# Altium footprint library bspd parts.PcbLib: 57 footprints (part 2 of 4)
Each footprint in its own frame and in the unit in brackets; x right, y up, seen from the top. Pads: shape width x height; smd on the part's side, far side on the other; paste and mask are expansions set on the pad; w line width, h text height; cw(c..) or ccw(c..) is an arc to the next point about the centre after c.
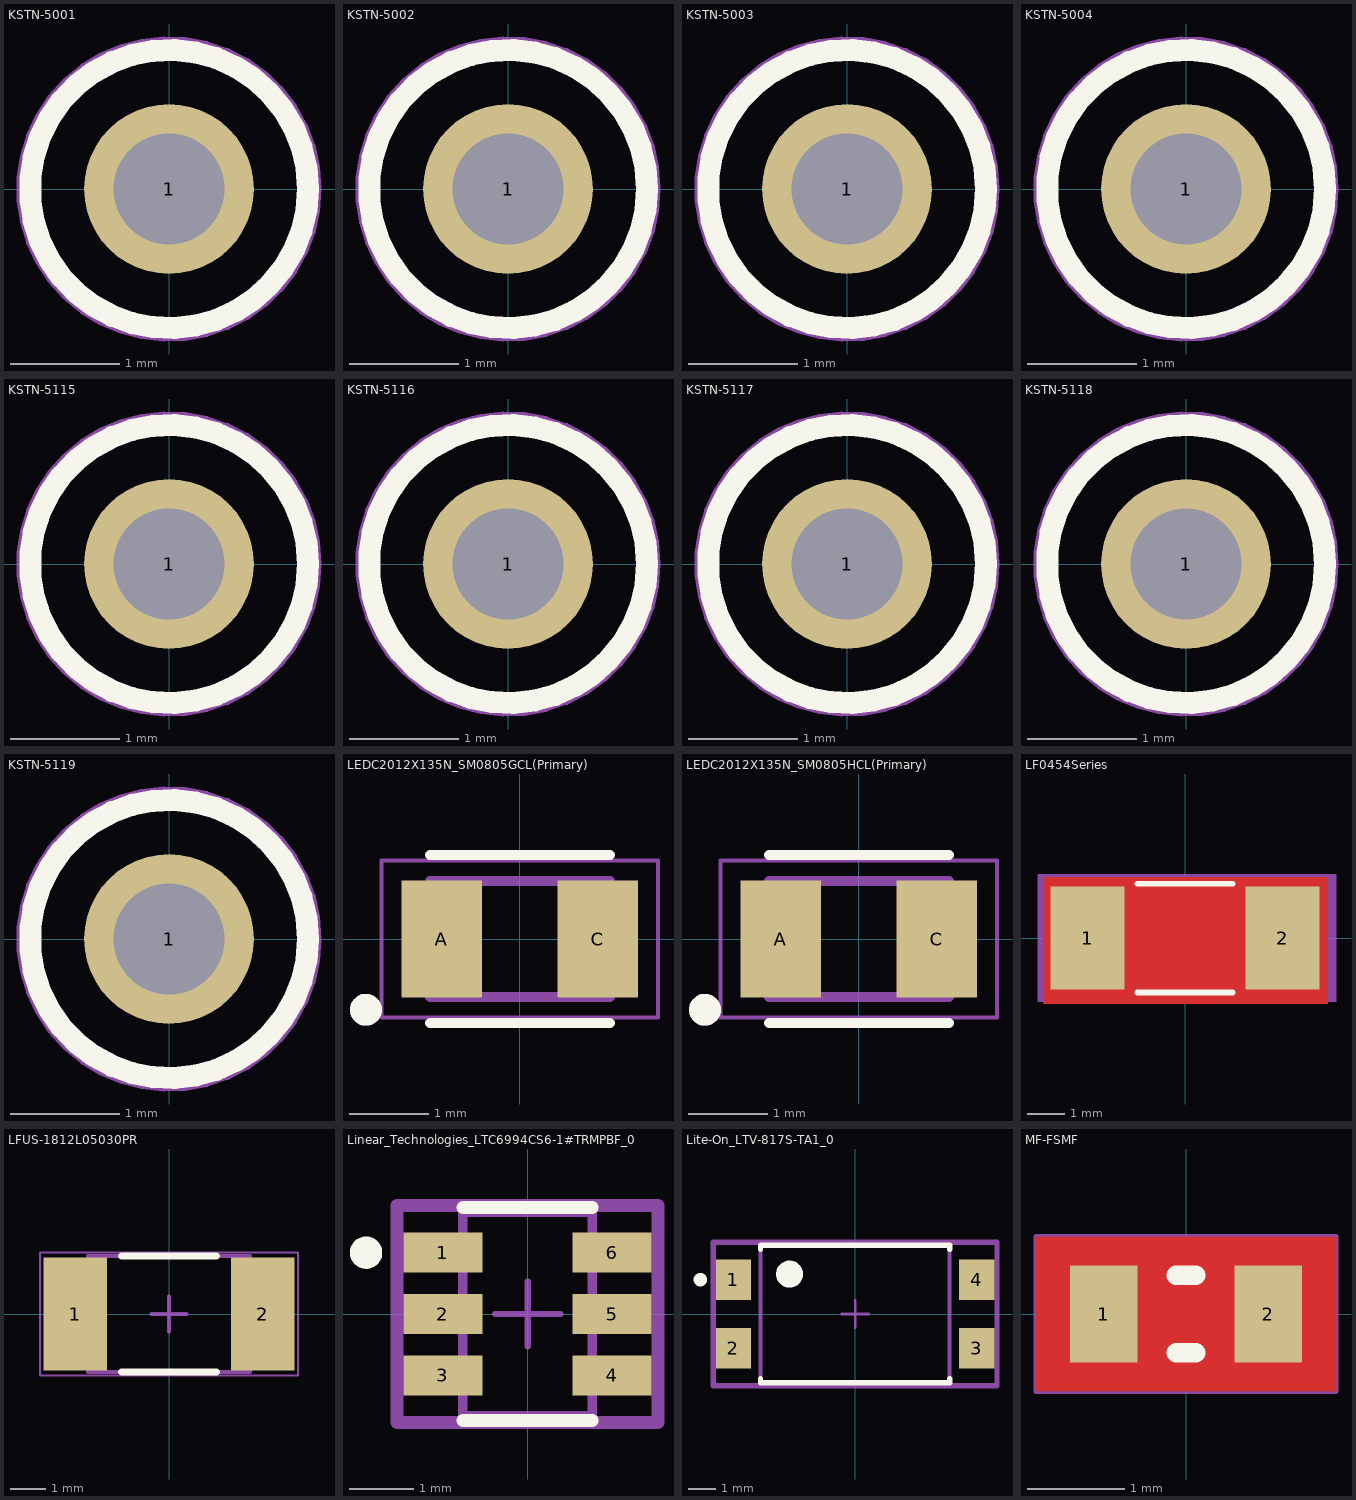
[diagram p1: the footprints below, top view; thin cyan lines are the x and y axes]

## KSTN-5001 [mm] "Test Point, Through Hole, Dia 2.54mm"
height 4.57
pads (1):
  round 1.55 hole 1.016: 1(0,0)
Top Overlay:
  circle w0.2: c0,0 r1.27
Mechanical 13:
  circle w0.1: c0,0 r1.27
Mechanical 15:
  circle w0.05: c0,0 r1.37
  lines w0.1: -0.5,0 0.5,0 ; 0,-0.5 0,0.5
3D body "Keystone_5001.STEP": height 4.62, standoff -3, extent -1.254,-1.247 1.246,1.253

## KSTN-5002 [mm] "Test Point, Through Hole, Dia 2.54mm"
height 4.57
pads (1):
  round 1.55 hole 1.016: 1(0,0)
Top Overlay:
  circle w0.2: c0,0 r1.27
Mechanical 13:
  circle w0.1: c0,0 r1.27
Mechanical 15:
  circle w0.05: c0,0 r1.37
  lines w0.1: -0.5,0 0.5,0 ; 0,-0.5 0,0.5
3D body "Keystone_5002.stp": height 4.62, standoff -3, extent -1.245,-1.245 1.246,1.251

## KSTN-5003 [mm] "Test Point, Through Hole, Dia 2.54mm"
height 4.57
pads (1):
  round 1.55 hole 1.016: 1(0,0)
Top Overlay:
  circle w0.2: c0,0 r1.27
Mechanical 13:
  circle w0.1: c0,0 r1.27
Mechanical 15:
  circle w0.05: c0,0 r1.37
  lines w0.1: -0.5,0 0.5,0 ; 0,-0.5 0,0.5
3D body "Keystone_5003.STEP": height 4.62, standoff -3, extent -1.254,-1.247 1.246,1.253

## KSTN-5004 [mm] "Test Point, Through Hole, Dia 2.54mm"
height 4.57
pads (1):
  round 1.55 hole 1.016: 1(0,0)
Top Overlay:
  circle w0.2: c0,0 r1.27
Mechanical 13:
  circle w0.1: c0,0 r1.27
Mechanical 15:
  circle w0.05: c0,0 r1.37
  lines w0.1: -0.5,0 0.5,0 ; 0,-0.5 0,0.5
3D body "Keystone_5004.STEP": height 4.62, standoff -3, extent -1.254,-1.247 1.246,1.253

## KSTN-5115 [mm] "Test Point, Through Hole, Dia 2.54mm"
height 4.57
pads (1):
  round 1.55 hole 1.016: 1(0,0)
Top Overlay:
  circle w0.2: c0,0 r1.27
Mechanical 13:
  circle w0.1: c0,0 r1.27
Mechanical 15:
  circle w0.05: c0,0 r1.37
  lines w0.1: -0.5,0 0.5,0 ; 0,-0.5 0,0.5
3D body "Keystone_5115.STEP": height 4.62, standoff -3, extent -1.254,-1.247 1.246,1.253

## KSTN-5116 [mm] "Test Point, Through Hole, Dia 2.54mm"
height 4.57
pads (1):
  round 1.55 hole 1.016: 1(0,0)
Top Overlay:
  circle w0.2: c0,0 r1.27
Mechanical 13:
  circle w0.1: c0,0 r1.27
Mechanical 15:
  circle w0.05: c0,0 r1.37
  lines w0.1: -0.5,0 0.5,0 ; 0,-0.5 0,0.5
3D body "Keystone_5116.STEP": height 4.62, standoff -3, extent -1.254,-1.247 1.246,1.253

## KSTN-5117 [mm] "Test Point, Through Hole, Dia 2.54mm"
height 4.57
pads (1):
  round 1.55 hole 1.016: 1(0,0)
Top Overlay:
  circle w0.2: c0,0 r1.27
Mechanical 13:
  circle w0.1: c0,0 r1.27
Mechanical 15:
  circle w0.05: c0,0 r1.37
  lines w0.1: -0.5,0 0.5,0 ; 0,-0.5 0,0.5
3D body "Keystone_5117.STEP": height 4.62, standoff -3, extent -1.254,-1.247 1.246,1.253

## KSTN-5118 [mm] "Test Point, Through Hole, Dia 2.54mm"
height 4.57
pads (1):
  round 1.55 hole 1.016: 1(0,0)
Top Overlay:
  circle w0.2: c0,0 r1.27
Mechanical 13:
  circle w0.1: c0,0 r1.27
Mechanical 15:
  circle w0.05: c0,0 r1.37
  lines w0.1: -0.5,0 0.5,0 ; 0,-0.5 0,0.5
3D body "Keystone_5118.STEP": height 4.62, standoff -3, extent -1.254,-1.247 1.246,1.253

## KSTN-5119 [mm] "Test Point, Through Hole, Dia 2.54mm"
height 4.57
pads (1):
  round 1.55 hole 1.016: 1(0,0)
Top Overlay:
  circle w0.2: c0,0 r1.27
Mechanical 13:
  circle w0.1: c0,0 r1.27
Mechanical 15:
  circle w0.05: c0,0 r1.37
  lines w0.1: -0.5,0 0.5,0 ; 0,-0.5 0,0.5
3D body "Keystone_5119.STEP": height 4.62, standoff -3, extent -1.254,-1.247 1.246,1.253

## LEDC2012X135N_SM0805GCL(Primary) [mm]
pads (2):
  rect 1.01x1.47 smd: A(-0.98,0) C(0.98,0)
Top Overlay:
  circle w0.2: c-1.932,-0.889 r0.1
  lines w0.127: -1.13,-1.055 1.13,-1.055 ; -1.13,1.055 1.13,1.055
Top Component Outline:
  lines w0.05: -1.735,-0.985 1.735,-0.985 1.735,0.985 -1.735,0.985 -1.735,-0.985
Top 3D Body:
  circle w0.2: c-1.932,-0.889 r0.1
  circle w0.2: c-1.932,-0.889 r0.1
  lines w0.127: -1.13,-0.73 1.13,-0.73 ; -1.13,-0.73 -1.13,0.73 ; -1.13,-0.73 1.13,-0.73 ; -1.13,-0.73 -1.13,0.73 ; -1.13,0.73 1.13,0.73 ; -1.13,0.73 1.13,0.73 ; 1.13,-0.73 1.13,0.73 ; 1.13,-0.73 1.13,0.73
3D body "SM0805GCL.STEP": height 1.12, standoff 0.03, extent -1.003,-0.622 1.003,0.622

## LEDC2012X135N_SM0805HCL(Primary) [mm]
pads (2):
  rect 1.01x1.47 smd: A(-0.98,0) C(0.98,0)
Top Overlay:
  circle w0.2: c-1.932,-0.889 r0.1
  lines w0.127: -1.13,-1.055 1.13,-1.055 ; -1.13,1.055 1.13,1.055
Top Component Outline:
  lines w0.05: -1.735,-0.985 -1.735,0.985 1.735,0.985 1.735,-0.985 -1.735,-0.985
Top 3D Body:
  circle w0.2: c-1.932,-0.889 r0.1
  circle w0.2: c-1.932,-0.889 r0.1
  lines w0.127: -1.13,-0.73 -1.13,0.73 ; -1.13,-0.73 1.13,-0.73 ; -1.13,-0.73 -1.13,0.73 ; -1.13,-0.73 1.13,-0.73 ; -1.13,0.73 1.13,0.73 ; -1.13,0.73 1.13,0.73 ; 1.13,-0.73 1.13,0.73 ; 1.13,-0.73 1.13,0.73
3D body "SM0805XXC.STEP": height 1.12, standoff 0.03, extent -1.003,-0.622 1.003,0.622

## LF0454Series [mil]
pads (2):
  rect 79x110 smd: 1(-104,0) 2(104,0)
Top Layer:
  pour cut-out: -151,65 152,65 152,-70 -151,-70
Bottom Layer:
  pour cut-out: -151,65 152,65 152,-70 -151,-70
Top Overlay:
  lines w6: -50.89,-58 50.89,-58 ; -50.89,58 50.89,58
Top Courtyard:
  region: 161,-68 -157,-68 -157,68 161,68
Mechanical 13:
  circle w0: c-110,0 r3
  lines w1: -120,-53 -120,53 ; -120,-53 -63,-53 -63,53 -120,53 ; -120,-53 120,-53 ; -120,-53 -120,53 ; -120,53 120,53 ; 120,-53 63,-53 63,53 120,53 ; 120,-53 120,53 ; 120,-53 120,53
3D body "0454005.MR.STEP": height 105.99, standoff 0.01, extent -120,-52.99 120,53

## LFUS-1812L05030PR [mm] "SMD, 2-Leads, Body 4.55x3.24mm"
height 1
pads (2):
  rect 1.78x3.15 smd: 1(-2.615,0) 2(2.615,0)
Top Overlay:
  lines w0.2: -1.325,-1.62 1.325,-1.62 ; -1.325,1.62 1.325,1.62
Mechanical 13:
  lines w0.1: -2.275,-1.62 -2.275,1.62 2.275,1.62 2.275,-1.62 -2.275,-1.62
Mechanical 15:
  lines w0.05: -3.605,-1.72 -3.605,1.72 3.605,1.72 3.605,-1.72 -3.605,-1.72
  lines w0.1: -0.5,0 0.5,0 ; 0,-0.5 0,0.5
3D body "1812L110-16DR--3DModel-STEP-56544.STEP": height 1.25, standoff 0, extent -2.275,-1.62 2.275,1.62

## Linear_Technologies_LTC6994CS6-1#TRMPBF_0 [mm]
pads (6):
  rect 1.22x0.62 smd: 1(-1.31,0.95) 2(-1.31,0) 3(-1.31,-0.95) 4(1.31,-0.95) 5(1.31,0) 6(1.31,0.95)
Top Overlay:
  circle w0.25: c-2.5,0.95 r0.125
  lines w0.2: -1.002,-1.647 1.002,-1.647 ; -1.002,1.647 1.002,1.647
Top Component Outline:
  lines w0.15: -1.002,-1.577 -1.002,1.577 1.002,1.577 1.002,-1.577 -1.002,-1.577
Top Courtyard:
  lines w0.2: -2.02,-1.677 2.02,-1.677 2.02,1.677 -2.02,1.677 -2.02,-1.677
Mechanical 10:
  text ".Designator" at 0,0 h1
Mechanical 15:
  lines w0.1: -0.503,0 0.503,0 ; 0,-0.503 0,0.503
  lines w0.2: -2.02,-1.677 -2.02,1.677 2.02,1.677 2.02,-1.677 -2.02,-1.677
3D body "IC_Linear_Technologies_LTC6994CS6-1#TRMPBF_eec.STEP": height 0.96, standoff -0.04, extent -1.412,-1.443 1.412,1.457

## Lite-On_LTV-817S-TA1_0 [mm]
pads (4):
  rect 1.3x1.5 smd: 1(-4.5,1.27) 2(-4.5,-1.27) 3(4.5,-1.27) 4(4.5,1.27)
Top Overlay:
  circle w0.5: c-2.425,1.475 r0.25
  circle w0.25: c-5.725,1.27 r0.125
  lines w0.2: -3.5,-2.395 -3.5,-2.55 3.5,-2.55 3.5,-2.395 ; -3.5,2.395 -3.5,2.55 3.5,2.55 3.5,2.395
Mechanical 10:
  lines w0.2: -5.25,-2.65 -5.25,2.65 5.25,2.65 5.25,-2.65 -5.25,-2.65
  text ".Designator" at 0,0 h1
Mechanical 12:
  lines w0.15: -3.5,-2.55 -3.5,2.55 3.5,2.55 3.5,-2.55 -3.5,-2.55
Mechanical 15:
  lines w0.1: -0.5,0 0.5,0 ; 0,-0.5 0,0.5
  lines w0.2: -5.25,-2.65 -5.25,2.65 5.25,2.65 5.25,-2.65 -5.25,-2.65
3D body "IC_Lite-On_LTV-817S-TA1_eec.STEP": height 0.25, standoff 0, extent -5.25,-2.65 5.25,2.65

## MF-FSMF [mm] "MF-FSMF Series - PTC Resettable Fuse"
height 0.65
pads (2):
  rect 0.7x1 smd: 1(-0.85,0) 2(0.85,0)
Top Layer:
  pour cut-out: -1.55,0.8 1.55,0.8 1.55,-0.8 -1.55,-0.8
Bottom Layer:
  pour cut-out: -1.55,0.8 1.55,0.8 1.55,-0.8 -1.55,-0.8
Top Overlay:
  lines w0.2: -0.1,-0.4 0.1,-0.4 ; -0.1,0.4 0.1,0.4
Top Assembly:
  lines w0.1: -0.925,-0.525 0.925,-0.525 0.925,0.525 -0.925,0.525 -0.925,-0.525
Top Courtyard:
  lines w0.05: -1.55,-0.8 1.55,-0.8 1.55,0.8 -1.55,0.8 -1.55,-0.8
  lines w0.1: -0.5,0 0.5,0 ; 0,-0.5 0,0.5
3D body "mf-fsmf010x.stp": height 0.48, standoff 0, extent -0.825,-0.425 0.825,0.425